# Altium footprint library MyLibrarySum.PcbLib: 208 footprints (part 12 of 13)
Each footprint in its own frame and in the unit in brackets; x right, y up, seen from the top. Pads: shape width x height; smd on the part's side, far side on the other; paste and mask are expansions set on the pad; w line width, h text height; cw(c..) or ccw(c..) is an arc to the next point about the centre after c.
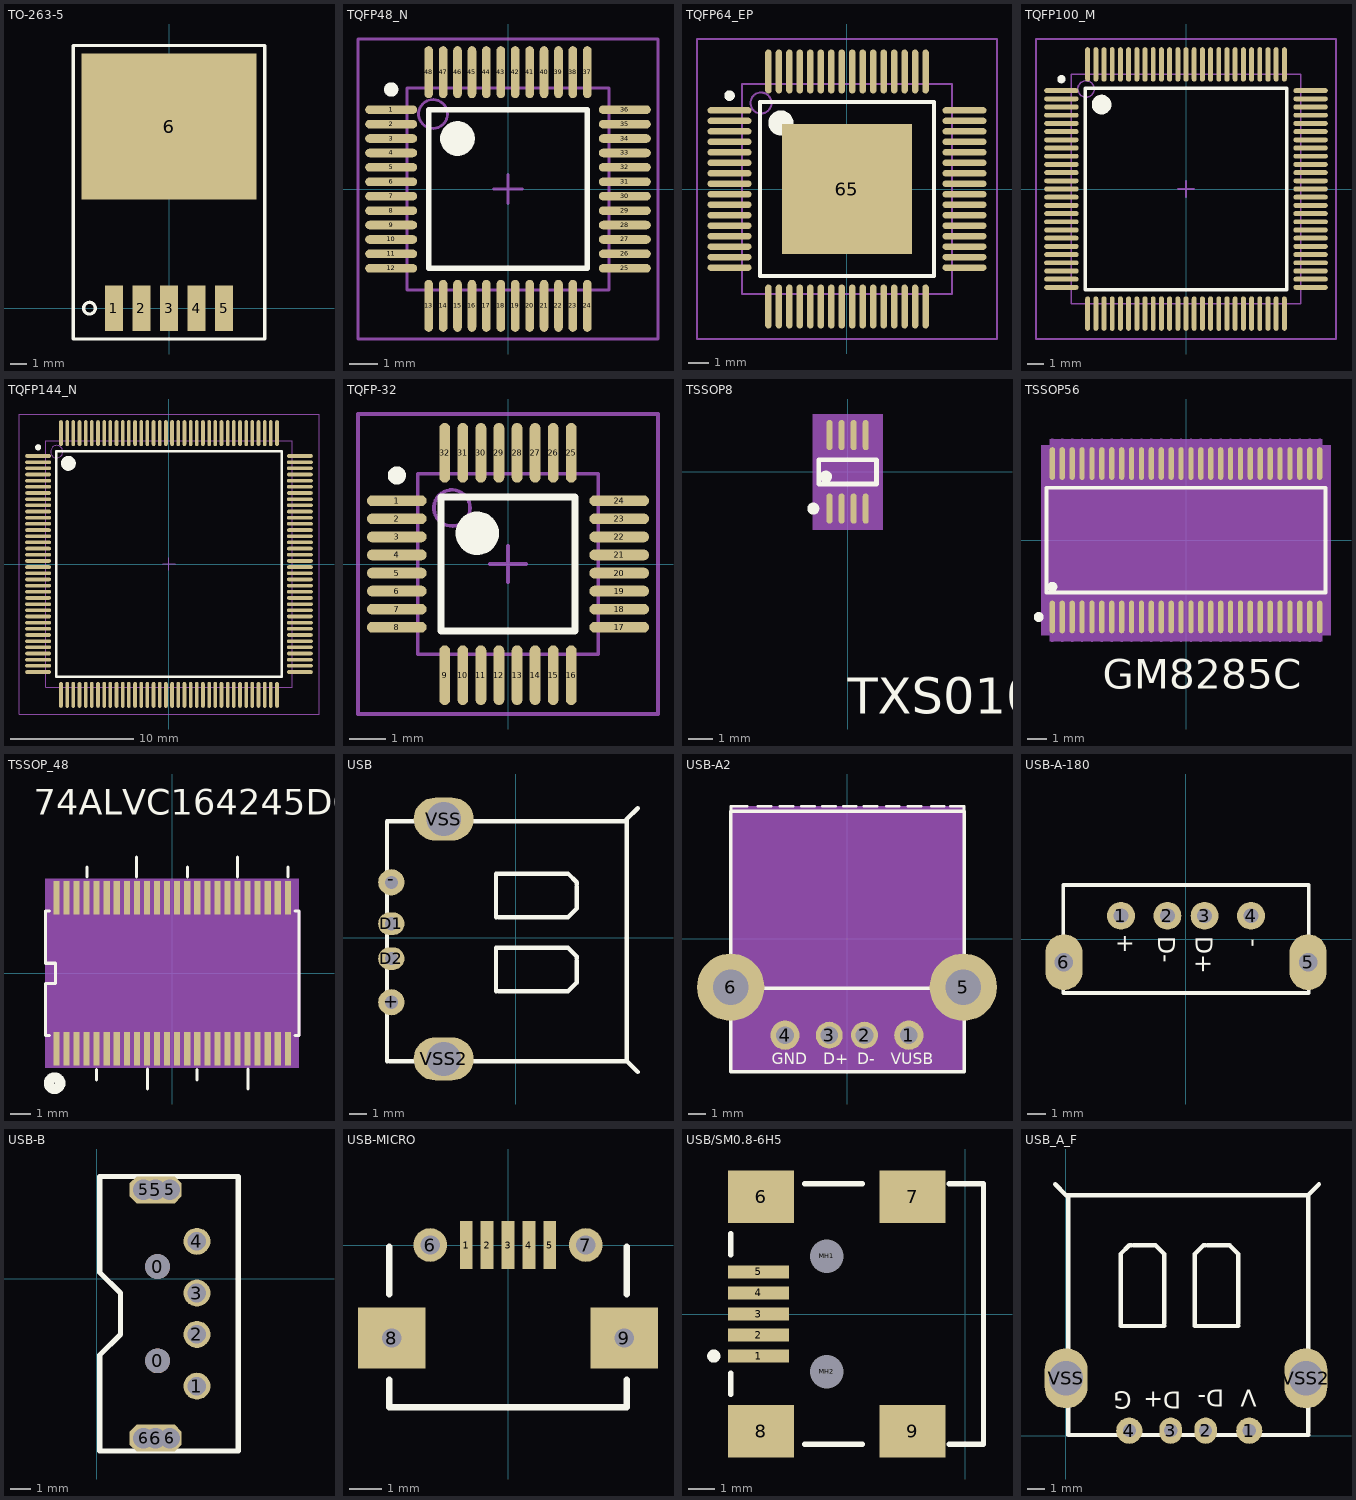
[diagram p11: the footprints below, top view; thin cyan lines are the x and y axes]

## TO-263-5 [mm]
pads (6):
  rect 1.1x2.8 smd: 1(-3.4,0) 2(-1.7,0) 3(0,0) 4(1.7,0) 5(3.4,0)
  rect 10.8x9 smd: 6(0,11.2)
Top Overlay:
  circle w0.2: c-4.902,0 r0.359
  lines w0.2: -5.9,-1.9 -5.9,16.2 5.9,16.2 5.9,-1.9 -5.9,-1.9
3D body: height 4.57, standoff -0.01, extent -5.08,-0.323 5.08,14.318

## TQFP48_N [mm] "Thin QFP, 48-Leads, Body 7x7mm, Pitch 0.5mm, IPC Medium Density"
height 1.6
pads (48):
  oval 1.8x0.3 smd: 1(-4.05,2.75) 2(-4.05,2.25) 3(-4.05,1.75) 4(-4.05,1.25) 5(-4.05,0.75) 6(-4.05,0.25) 7(-4.05,-0.25) 8(-4.05,-0.75) 9(-4.05,-1.25) 10(-4.05,-1.75) 11(-4.05,-2.25) 12(-4.05,-2.75) 25(4.05,-2.75) 26(4.05,-2.25) 27(4.05,-1.75) 28(4.05,-1.25) 29(4.05,-0.75) 30(4.05,-0.25) 31(4.05,0.25) 32(4.05,0.75) 33(4.05,1.25) 34(4.05,1.75) 35(4.05,2.25) 36(4.05,2.75)
  oval 0.3x1.8 smd: 13(-2.75,-4.05) 14(-2.25,-4.05) 15(-1.75,-4.05) 16(-1.25,-4.05) 17(-0.75,-4.05) 18(-0.25,-4.05) 19(0.25,-4.05) 20(0.75,-4.05) 21(1.25,-4.05) 22(1.75,-4.05) 23(2.25,-4.05) 24(2.75,-4.05) 37(2.75,4.05) 38(2.25,4.05) 39(1.75,4.05) 40(1.25,4.05) 41(0.75,4.05) 42(0.25,4.05) 43(-0.25,4.05) 44(-0.75,4.05) 45(-1.25,4.05) 46(-1.75,4.05) 47(-2.25,4.05) 48(-2.75,4.05)
Top Overlay:
  circle w0.25: c-4.05,3.45 r0.125
  circle w0.6: c-1.75,1.75 r0.3
  lines w0.2: -2.75,-2.75 -2.75,2.75 2.75,2.75 2.75,-2.75 -2.75,-2.75
Mechanical 13:
  circle w0.1: c-2.6,2.6 r0.5
  lines w0.1: -3.5,-3.5 -3.5,3.5 3.5,3.5 3.5,-3.5 -3.5,-3.5
Mechanical 15:
  lines w0.1: -0.5,0 0.5,0 ; 0,-0.5 0,0.5 ; -5.2,-5.2 -5.2,5.2 5.2,5.2 5.2,-5.2 -5.2,-5.2
3D body: height 1.1, standoff 0, extent -4.572,-4.445 4.445,4.572

## TQFP64_EP [mm]
height 1.2
pads (65):
  oval 2.1x0.3 smd: 1(-5.6,3.75) 2(-5.6,3.25) 3(-5.6,2.75) 4(-5.6,2.25) 5(-5.6,1.75) 6(-5.6,1.25) 7(-5.6,0.75) 8(-5.6,0.25) 9(-5.6,-0.25) 10(-5.6,-0.75) 11(-5.6,-1.25) 12(-5.6,-1.75) 13(-5.6,-2.25) 14(-5.6,-2.75) 15(-5.6,-3.25) 16(-5.6,-3.75) 33(5.6,-3.75) 34(5.6,-3.25) 35(5.6,-2.75) 36(5.6,-2.25) 37(5.6,-1.75) 38(5.6,-1.25) 39(5.6,-0.75) 40(5.6,-0.25) 41(5.6,0.25) 42(5.6,0.75) 43(5.6,1.25) 44(5.6,1.75) 45(5.6,2.25) 46(5.6,2.75) 47(5.6,3.25) 48(5.6,3.75)
  oval 0.3x2.1 smd: 17(-3.75,-5.6) 18(-3.25,-5.6) 19(-2.75,-5.6) 20(-2.25,-5.6) 21(-1.75,-5.6) 22(-1.25,-5.6) 23(-0.75,-5.6) 24(-0.25,-5.6) 25(0.25,-5.6) 26(0.75,-5.6) 27(1.25,-5.6) 28(1.75,-5.6) 29(2.25,-5.6) 30(2.75,-5.6) 31(3.25,-5.6) 32(3.75,-5.6) 49(3.75,5.6) 50(3.25,5.6) 51(2.75,5.6) 52(2.25,5.6) 53(1.75,5.6) 54(1.25,5.6) 55(0.75,5.6) 56(0.25,5.6) 57(-0.25,5.6) 58(-0.75,5.6) 59(-1.25,5.6) 60(-1.75,5.6) 61(-2.25,5.6) 62(-2.75,5.6) 63(-3.25,5.6) 64(-3.75,5.6)
  rect 6.2x6.2 smd: 65(0,0)
Top Overlay:
  circle w0.6: c-3.15,3.15 r0.3
  circle w0.25: c-5.6,4.45 r0.125
  lines w0.2: -4.15,-4.15 4.15,-4.15 4.15,4.15 -4.15,4.15 -4.15,-4.15
Mechanical 13:
  circle w0.1: c-4.1,4.1 r0.5
  lines w0.1: -5,-5 5,-5 5,5 -5,5 -5,-5
Mechanical 15:
  lines w0.1: -0.5,0 0.5,0 ; 0,-0.5 0,0.5 ; -7.15,-7.15 7.15,-7.15 7.15,7.15 -7.15,7.15 -7.15,-7.15
3D body: height 1.1, standoff 0, extent -5.969,-5.969 6.048,6.048

## TQFP100_M [mm] "Thin QFP, 100-Leads, Body 14x14mm, Pitch 0.5mm, IPC Low Density"
height 1.2
pads (100):
  oval 2.1x0.3 smd: 1(-7.6,6) 2(-7.6,5.5) 3(-7.6,5) 4(-7.6,4.5) 5(-7.6,4) 6(-7.6,3.5) 7(-7.6,3) 8(-7.6,2.5) 9(-7.6,2) 10(-7.6,1.5) 11(-7.6,1) 12(-7.6,0.5) 13(-7.6,0) 14(-7.6,-0.5) 15(-7.6,-1) 16(-7.6,-1.5) 17(-7.6,-2) 18(-7.6,-2.5) 19(-7.6,-3) 20(-7.6,-3.5) 21(-7.6,-4) 22(-7.6,-4.5) 23(-7.6,-5) 24(-7.6,-5.5) 25(-7.6,-6) 51(7.6,-6) 52(7.6,-5.5) 53(7.6,-5) 54(7.6,-4.5) 55(7.6,-4) 56(7.6,-3.5) 57(7.6,-3) 58(7.6,-2.5) 59(7.6,-2) 60(7.6,-1.5) 61(7.6,-1) 62(7.6,-0.5) 63(7.6,0) 64(7.6,0.5) 65(7.6,1) 66(7.6,1.5) 67(7.6,2) 68(7.6,2.5) 69(7.6,3) 70(7.6,3.5) 71(7.6,4) 72(7.6,4.5) 73(7.6,5) 74(7.6,5.5) 75(7.6,6)
  oval 0.3x2.1 smd: 26(-6,-7.6) 27(-5.5,-7.6) 28(-5,-7.6) 29(-4.5,-7.6) 30(-4,-7.6) 31(-3.5,-7.6) 32(-3,-7.6) 33(-2.5,-7.6) 34(-2,-7.6) 35(-1.5,-7.6) 36(-1,-7.6) 37(-0.5,-7.6) 38(0,-7.6) 39(0.5,-7.6) 40(1,-7.6) 41(1.5,-7.6) 42(2,-7.6) 43(2.5,-7.6) 44(3,-7.6) 45(3.5,-7.6) 46(4,-7.6) 47(4.5,-7.6) 48(5,-7.6) 49(5.5,-7.6) 50(6,-7.6) 76(6,7.6) 77(5.5,7.6) 78(5,7.6) 79(4.5,7.6) 80(4,7.6) 81(3.5,7.6) 82(3,7.6) 83(2.5,7.6) 84(2,7.6) 85(1.5,7.6) 86(1,7.6) 87(0.5,7.6) 88(0,7.6) 89(-0.5,7.6) 90(-1,7.6) 91(-1.5,7.6) 92(-2,7.6) 93(-2.5,7.6) 94(-3,7.6) 95(-3.5,7.6) 96(-4,7.6) 97(-4.5,7.6) 98(-5,7.6) 99(-5.5,7.6) 100(-6,7.6)
Top Overlay:
  circle w0.6: c-5.15,5.15 r0.3
  circle w0.25: c-7.6,6.7 r0.125
  lines w0.2: -6.15,-6.15 6.15,-6.15 6.15,6.15 -6.15,6.15 -6.15,-6.15
Mechanical 13:
  circle w0.1: c-6.1,6.1 r0.5
  lines w0.1: -7,-7 7,-7 7,7 -7,7 -7,-7
Mechanical 15:
  lines w0.1: -0.5,0 0.5,0 ; 0,-0.5 0,0.5 ; -9.15,-9.15 9.15,-9.15 9.15,9.15 -9.15,9.15 -9.15,-9.15
3D body: height 1.54, standoff -0.19, extent -7.6,-7.505 7.41,7.505

## TQFP144_N [mm] "TTM32V103ZET6"
height 1.6
pads (144):
  oval 2.1x0.3 smd: 1(-10.6,8.75) 2(-10.6,8.25) 3(-10.6,7.75) 4(-10.6,7.25) 5(-10.6,6.75) 6(-10.6,6.25) 7(-10.6,5.75) 8(-10.6,5.25) 9(-10.6,4.75) 10(-10.6,4.25) 11(-10.6,3.75) 12(-10.6,3.25) 13(-10.6,2.75) 14(-10.6,2.25) 15(-10.6,1.75) 16(-10.6,1.25) 17(-10.6,0.75) 18(-10.6,0.25) 19(-10.6,-0.25) 20(-10.6,-0.75) 21(-10.6,-1.25) 22(-10.6,-1.75) 23(-10.6,-2.25) 24(-10.6,-2.75) 25(-10.6,-3.25) 26(-10.6,-3.75) 27(-10.6,-4.25) 28(-10.6,-4.75) 29(-10.6,-5.25) 30(-10.6,-5.75) 31(-10.6,-6.25) 32(-10.6,-6.75) 33(-10.6,-7.25) 34(-10.6,-7.75) 35(-10.6,-8.25) 36(-10.6,-8.75) 73(10.6,-8.75) 74(10.6,-8.25) 75(10.6,-7.75) 76(10.6,-7.25) 77(10.6,-6.75) 78(10.6,-6.25) 79(10.6,-5.75) 80(10.6,-5.25) 81(10.6,-4.75) 82(10.6,-4.25) 83(10.6,-3.75) 84(10.6,-3.25) 85(10.6,-2.75) 86(10.6,-2.25) 87(10.6,-1.75) 88(10.6,-1.25) 89(10.6,-0.75) 90(10.6,-0.25) 91(10.6,0.25) 92(10.6,0.75) 93(10.6,1.25) 94(10.6,1.75) 95(10.6,2.25) 96(10.6,2.75) 97(10.6,3.25) 98(10.6,3.75) 99(10.6,4.25) 100(10.6,4.75) 101(10.6,5.25) 102(10.6,5.75) 103(10.6,6.25) 104(10.6,6.75) 105(10.6,7.25) 106(10.6,7.75) 107(10.6,8.25) 108(10.6,8.75)
  oval 0.3x2.1 smd: 37(-8.75,-10.6) 38(-8.25,-10.6) 39(-7.75,-10.6) 40(-7.25,-10.6) 41(-6.75,-10.6) 42(-6.25,-10.6) 43(-5.75,-10.6) 44(-5.25,-10.6) 45(-4.75,-10.6) 46(-4.25,-10.6) 47(-3.75,-10.6) 48(-3.25,-10.6) 49(-2.75,-10.6) 50(-2.25,-10.6) 51(-1.75,-10.6) 52(-1.25,-10.6) 53(-0.75,-10.6) 54(-0.25,-10.6) 55(0.25,-10.6) 56(0.75,-10.6) 57(1.25,-10.6) 58(1.75,-10.6) 59(2.25,-10.6) 60(2.75,-10.6) 61(3.25,-10.6) 62(3.75,-10.6) 63(4.25,-10.6) 64(4.75,-10.6) 65(5.25,-10.6) 66(5.75,-10.6) 67(6.25,-10.6) 68(6.75,-10.6) 69(7.25,-10.6) 70(7.75,-10.6) 71(8.25,-10.6) 72(8.75,-10.6) 109(8.75,10.6) 110(8.25,10.6) 111(7.75,10.6) 112(7.25,10.6) 113(6.75,10.6) 114(6.25,10.6) 115(5.75,10.6) 116(5.25,10.6) 117(4.75,10.6) 118(4.25,10.6) 119(3.75,10.6) 120(3.25,10.6) 121(2.75,10.6) 122(2.25,10.6) 123(1.75,10.6) 124(1.25,10.6) 125(0.75,10.6) 126(0.25,10.6) 127(-0.25,10.6) 128(-0.75,10.6) 129(-1.25,10.6) 130(-1.75,10.6) 131(-2.25,10.6) 132(-2.75,10.6) 133(-3.25,10.6) 134(-3.75,10.6) 135(-4.25,10.6) 136(-4.75,10.6) 137(-5.25,10.6) 138(-5.75,10.6) 139(-6.25,10.6) 140(-6.75,10.6) 141(-7.25,10.6) 142(-7.75,10.6) 143(-8.25,10.6) 144(-8.75,10.6)
Top Overlay:
  circle w0.6: c-8.15,8.15 r0.3
  circle w0.25: c-10.6,9.45 r0.125
  lines w0.2: -9.15,-9.15 9.15,-9.15 9.15,9.15 -9.15,9.15 -9.15,-9.15
Mechanical 13:
  circle w0.1: c-9.1,9.1 r0.5
  lines w0.1: -10,-10 10,-10 10,10 -10,10 -10,-10
Mechanical 15:
  lines w0.1: -0.5,0 0.5,0 ; 0,-0.5 0,0.5 ; -12.15,-12.15 12.15,-12.15 12.15,12.15 -12.15,12.15 -12.15,-12.15
3D body: height 0.8, standoff -0.85, extent -10.951,-10.951 11.049,11.049

## TQFP-32 [mm]
height 1.2
pads (32):
  oval 1.65x0.3 smd: 1(-3.075,1.75) 2(-3.075,1.25) 3(-3.075,0.75) 4(-3.075,0.25) 5(-3.075,-0.25) 6(-3.075,-0.75) 7(-3.075,-1.25) 8(-3.075,-1.75) 17(3.075,-1.75) 18(3.075,-1.25) 19(3.075,-0.75) 20(3.075,-0.25) 21(3.075,0.25) 22(3.075,0.75) 23(3.075,1.25) 24(3.075,1.75)
  oval 0.3x1.65 smd: 9(-1.75,-3.075) 10(-1.25,-3.075) 11(-0.75,-3.075) 12(-0.25,-3.075) 13(0.25,-3.075) 14(0.75,-3.075) 15(1.25,-3.075) 16(1.75,-3.075) 25(1.75,3.075) 26(1.25,3.075) 27(0.75,3.075) 28(0.25,3.075) 29(-0.25,3.075) 30(-0.75,3.075) 31(-1.25,3.075) 32(-1.75,3.075)
Top Overlay:
  circle w0.6: c-0.85,0.85 r0.3
  circle w0.25: c-3.075,2.45 r0.125
  lines w0.2: -1.85,-1.85 1.85,-1.85 1.85,1.85 -1.85,1.85 -1.85,-1.85
Mechanical 13:
  circle w0.1: c-1.55,1.55 r0.5
  lines w0.1: -2.5,-2.5 2.5,-2.5 2.5,2.5 -2.5,2.5 -2.5,-2.5
Mechanical 15:
  lines w0.1: -0.5,0 0.5,0 ; 0,-0.5 0,0.5 ; -4.15,-4.15 4.15,-4.15 4.15,4.15 -4.15,4.15 -4.15,-4.15
3D body: height 0.65, standoff -0.58, extent -3.556,-3.5 3.444,3.5

## TSSOP8 [mm] "TSSOP8"
pads (8):
  oval 0.25x1.25 smd: 1(-0.75,-1.525) 2(-0.25,-1.525) 3(0.25,-1.525) 4(0.75,-1.525) 5(0.75,1.525) 6(0.25,1.525) 7(-0.25,1.525) 8(-0.75,1.525)
Top Overlay:
  circle w0.25: c-0.9,-0.2 r0.125
  circle w0.25: c-1.425,-1.525 r0.125
  lines w0.2: -1.2,-0.5 1.2,-0.5 1.2,0.5 -1.2,0.5 -1.2,-0.5
  text "TXS0102DCU" at 0,-10.05 h1.5
Mechanical 11:
  text "3" at 0.25,-1.885 h0.4
  text "5" at 0.75,1.165 h0.4
  text "7" at -0.25,1.165 h0.4
  text "2" at -0.25,-1.885 h0.4
  text "1" at -0.75,-1.885 h0.4
  text "8" at -0.75,1.165 h0.4
  text "4" at 0.75,-1.885 h0.4
  text "6" at 0.25,1.165 h0.4
Mechanical 12:
  circle w0.4: c-0.7,-0.55 r0.2
  lines w0.2: -0.75,-1.2 -0.75,-1.05 ; -0.75,1.05 -0.75,1.2 ; -0.25,-1.2 -0.25,-1.05 ; -0.25,1.05 -0.25,1.2 ; 0.25,-1.2 0.25,-1.05 ; 0.25,1.05 0.25,1.2 ; 0.75,-1.2 0.75,-1.05 ; 0.75,1.05 0.75,1.2 ; -1.2,-1.05 1.2,-1.05 1.2,1.05 -1.2,1.05 -1.2,-1.05
  lines w0.25: -0.75,-1.55 -0.75,-1.2 ; -0.75,1.2 -0.75,1.55 ; -0.25,-1.55 -0.25,-1.2 ; -0.25,1.2 -0.25,1.55 ; 0.25,-1.55 0.25,-1.2 ; 0.25,1.2 0.25,1.55 ; 0.75,-1.55 0.75,-1.2 ; 0.75,1.2 0.75,1.55
  text "pn" at 0,-0.52 h0.4
Mechanical 13:
  region: -1.45,-2.4 1.45,-2.4 1.45,2.4 -1.45,2.4
Mechanical 16:
  pour cut-out: -0.875,-1.6 -0.875,-1.05 -1.2,-1.05 -1.2,1.05 -0.875,1.05 -0.875,1.6 0.875,1.6 0.875,1.05 1.2,1.05 1.2,-1.05 0.875,-1.05 0.875,-1.6
3D body: height 1.1, standoff 0, extent -1.423,-2.032 1.677,2.068

## TSSOP56 [mm] "TSSOP56"
pads (56):
  oval 0.27x1.65 smd: 1(-6.75,-3.875) 2(-6.25,-3.875) 3(-5.75,-3.875) 4(-5.25,-3.875) 5(-4.75,-3.875) 6(-4.25,-3.875) 7(-3.75,-3.875) 8(-3.25,-3.875) 9(-2.75,-3.875) 10(-2.25,-3.875) 11(-1.75,-3.875) 12(-1.25,-3.875) 13(-0.75,-3.875) 14(-0.25,-3.875) 15(0.25,-3.875) 16(0.75,-3.875) 17(1.25,-3.875) 18(1.75,-3.875) 19(2.25,-3.875) 20(2.75,-3.875) 21(3.25,-3.875) 22(3.75,-3.875) 23(4.25,-3.875) 24(4.75,-3.875) 25(5.25,-3.875) 26(5.75,-3.875) 27(6.25,-3.875) 28(6.75,-3.875) 29(6.75,3.875) 30(6.25,3.875) 31(5.75,3.875) 32(5.25,3.875) 33(4.75,3.875) 34(4.25,3.875) 35(3.75,3.875) 36(3.25,3.875) 37(2.75,3.875) 38(2.25,3.875) 39(1.75,3.875) 40(1.25,3.875) 41(0.75,3.875) 42(0.25,3.875) 43(-0.25,3.875) 44(-0.75,3.875) 45(-1.25,3.875) 46(-1.75,3.875) 47(-2.25,3.875) 48(-2.75,3.875) 49(-3.25,3.875) 50(-3.75,3.875) 51(-4.25,3.875) 52(-4.75,3.875) 53(-5.25,3.875) 54(-5.75,3.875) 55(-6.25,3.875) 56(-6.75,3.875)
Top Overlay:
  circle w0.25: c-7.435,-3.875 r0.125
  circle w0.25: c-6.75,-2.35 r0.125
  lines w0.2: -7.05,-2.65 -7.05,2.65 7.05,2.65 7.05,-2.65 -7.05,-2.65
  text "GM8285C" at -4.2,-7.5 h1.5
Mechanical 11:
  text "38" at 1.93,3.675 h0.4
  text "37" at 2.43,3.675 h0.4
  text "48" at -3.07,3.675 h0.4
  text "17" at 0.93,-4.075 h0.4
  text "45" at -1.57,3.675 h0.4
  text "41" at 0.43,3.675 h0.4
  text "47" at -2.57,3.675 h0.4
  text "40" at 0.93,3.675 h0.4
  text "39" at 1.43,3.675 h0.4
  text "46" at -2.07,3.675 h0.4
  text "42" at -0.07,3.675 h0.4
  text "24" at 4.43,-4.075 h0.4
  text "23" at 3.93,-4.075 h0.4
  text "22" at 3.43,-4.075 h0.4
  text "20" at 2.43,-4.075 h0.4
  text "19" at 1.93,-4.075 h0.4
  text "15" at -0.07,-4.075 h0.4
  text "52" at -5.07,3.675 h0.4
  text "11" at -2.07,-4.075 h0.4
  text "14" at -0.57,-4.075 h0.4
  text "12" at -1.57,-4.075 h0.4
  text "51" at -4.57,3.675 h0.4
  text "56" at -7.07,3.675 h0.4
  text "4" at -5.41,-4.075 h0.4
  text "3" at -5.91,-4.075 h0.4
  text "54" at -6.07,3.675 h0.4
  text "7" at -3.91,-4.075 h0.4
  text "6" at -4.41,-4.075 h0.4
  text "55" at -6.57,3.675 h0.4
  text "29" at 6.43,3.675 h0.4
  text "36" at 2.93,3.675 h0.4
  text "35" at 3.43,3.675 h0.4
  text "33" at 4.43,3.675 h0.4
  text "49" at -3.57,3.675 h0.4
  text "50" at -4.07,3.675 h0.4
  text "53" at -5.57,3.675 h0.4
  text "10" at -2.57,-4.075 h0.4
  text "5" at -4.91,-4.075 h0.4
  text "8" at -3.41,-4.075 h0.4
  text "2" at -6.41,-4.075 h0.4
  text "18" at 1.43,-4.075 h0.4
  text "21" at 2.93,-4.075 h0.4
  text "25" at 4.93,-4.075 h0.4
  text "16" at 0.43,-4.075 h0.4
  text "13" at -1.07,-4.075 h0.4
  text "43" at -0.57,3.675 h0.4
  text "32" at 4.93,3.675 h0.4
  text "27" at 5.93,-4.075 h0.4
  text "28" at 6.43,-4.075 h0.4
  text "30" at 5.93,3.675 h0.4
  text "31" at 5.43,3.675 h0.4
  text "1" at -6.91,-4.075 h0.4
  text "26" at 5.43,-4.075 h0.4
  text "9" at -2.91,-4.075 h0.4
  text "44" at -1.07,3.675 h0.4
  text "34" at 3.93,3.675 h0.4
Mechanical 12:
  circle w0.4: c-6.55,-3.55 r0.2
  lines w0.2: -6.75,-4.25 -6.75,-4.05 ; -6.75,4.05 -6.75,4.25 ; -6.25,-4.25 -6.25,-4.05 ; -6.25,4.05 -6.25,4.25 ; -5.75,-4.25 -5.75,-4.05 ; -5.75,4.05 -5.75,4.25 ; -5.25,-4.25 -5.25,-4.05 ; -5.25,4.05 -5.25,4.25 ; -4.75,-4.25 -4.75,-4.05 ; -4.75,4.05 -4.75,4.25 ; -4.25,-4.25 -4.25,-4.05 ; -4.25,4.05 -4.25,4.25 ; -3.75,-4.25 -3.75,-4.05 ; -3.75,4.05 -3.75,4.25 ; -3.25,-4.25 -3.25,-4.05 ; -3.25,4.05 -3.25,4.25 ; -2.75,-4.25 -2.75,-4.05 ; -2.75,4.05 -2.75,4.25 ; -2.25,-4.25 -2.25,-4.05 ; -2.25,4.05 -2.25,4.25 ; -1.75,-4.25 -1.75,-4.05 ; -1.75,4.05 -1.75,4.25 ; -1.25,-4.25 -1.25,-4.05 ; -1.25,4.05 -1.25,4.25 ; -0.75,-4.25 -0.75,-4.05 ; -0.75,4.05 -0.75,4.25 ; -0.25,-4.25 -0.25,-4.05 ; -0.25,4.05 -0.25,4.25 ; 0.25,-4.25 0.25,-4.05 ; 0.25,4.05 0.25,4.25 ; 0.75,-4.25 0.75,-4.05 ; 0.75,4.05 0.75,4.25 ; 1.25,-4.25 1.25,-4.05 ; 1.25,4.05 1.25,4.25 ; 1.75,-4.25 1.75,-4.05 ; 1.75,4.05 1.75,4.25 ; 2.25,-4.25 2.25,-4.05 ; 2.25,4.05 2.25,4.25 ; 2.75,-4.25 2.75,-4.05 ; 2.75,4.05 2.75,4.25 ; 3.25,-4.25 3.25,-4.05 ; 3.25,4.05 3.25,4.25 ; 3.75,-4.25 3.75,-4.05 ; 3.75,4.05 3.75,4.25 ; 4.25,-4.25 4.25,-4.05 ; 4.25,4.05 4.25,4.25 ; 4.75,-4.25 4.75,-4.05 ; 4.75,4.05 4.75,4.25 ; 5.25,-4.25 5.25,-4.05 ; 5.25,4.05 5.25,4.25 ; 5.75,-4.25 5.75,-4.05 ; 5.75,4.05 5.75,4.25 ; 6.25,-4.25 6.25,-4.05 ; 6.25,4.05 6.25,4.25 ; 6.75,-4.25 6.75,-4.05 ; 6.75,4.05 6.75,4.25 ; -7.05,-4.05 -7.05,4.05 7.05,4.05 7.05,-4.05 -7.05,-4.05
  lines w0.27: -6.75,-5 -6.75,-4.25 ; -6.75,4.25 -6.75,5 ; -6.25,-5 -6.25,-4.25 ; -6.25,4.25 -6.25,5 ; -5.75,-5 -5.75,-4.25 ; -5.75,4.25 -5.75,5 ; -5.25,-5 -5.25,-4.25 ; -5.25,4.25 -5.25,5 ; -4.75,-5 -4.75,-4.25 ; -4.75,4.25 -4.75,5 ; -4.25,-5 -4.25,-4.25 ; -4.25,4.25 -4.25,5 ; -3.75,-5 -3.75,-4.25 ; -3.75,4.25 -3.75,5 ; -3.25,-5 -3.25,-4.25 ; -3.25,4.25 -3.25,5 ; -2.75,-5 -2.75,-4.25 ; -2.75,4.25 -2.75,5 ; -2.25,-5 -2.25,-4.25 ; -2.25,4.25 -2.25,5 ; -1.75,-5 -1.75,-4.25 ; -1.75,4.25 -1.75,5 ; -1.25,-5 -1.25,-4.25 ; -1.25,4.25 -1.25,5 ; -0.75,-5 -0.75,-4.25 ; -0.75,4.25 -0.75,5 ; -0.25,-5 -0.25,-4.25 ; -0.25,4.25 -0.25,5 ; 0.25,-5 0.25,-4.25 ; 0.25,4.25 0.25,5 ; 0.75,-5 0.75,-4.25 ; 0.75,4.25 0.75,5 ; 1.25,-5 1.25,-4.25 ; 1.25,4.25 1.25,5 ; 1.75,-5 1.75,-4.25 ; 1.75,4.25 1.75,5 ; 2.25,-5 2.25,-4.25 ; 2.25,4.25 2.25,5 ; 2.75,-5 2.75,-4.25 ; 2.75,4.25 2.75,5 ; 3.25,-5 3.25,-4.25 ; 3.25,4.25 3.25,5 ; 3.75,-5 3.75,-4.25 ; 3.75,4.25 3.75,5 ; 4.25,-5 4.25,-4.25 ; 4.25,4.25 4.25,5 ; 4.75,-5 4.75,-4.25 ; 4.75,4.25 4.75,5 ; 5.25,-5 5.25,-4.25 ; 5.25,4.25 5.25,5 ; 5.75,-5 5.75,-4.25 ; 5.75,4.25 5.75,5 ; 6.25,-5 6.25,-4.25 ; 6.25,4.25 6.25,5 ; 6.75,-5 6.75,-4.25 ; 6.75,4.25 6.75,5
  text ".Designator" at -0.48,-0.2 h0.4
  text "GM8285C" at -1.12,-0.2 h0.4
  text "RichardLC" at -1.44,-0.2 h0.4
  text "pn" at -0.32,-0.2 h0.4
Mechanical 13:
  region: 7.3,-4.8 7.3,4.8 -7.3,4.8 -7.3,-4.8
Mechanical 16:
  pour cut-out: -6.885,-5.1 -6.885,-4.05 -7.05,-4.05 -7.05,4.05 -6.885,4.05 -6.885,5.1 6.885,5.1 6.885,4.05 7.05,4.05 7.05,-4.05 6.885,-4.05 6.885,-5.1

## TSSOP_48 [mil] "TSSOP_48"
pads (48):
  rect 12x65 smd: 1(-226.38,-147.64) 2(-206.69,-147.64) 3(-187.01,-147.64) 4(-167.32,-147.64) 5(-147.64,-147.64) 6(-127.95,-147.64) 7(-108.27,-147.64) 8(-88.58,-147.64) 9(-68.9,-147.64) 10(-49.21,-147.64) 11(-29.53,-147.64) 12(-9.84,-147.64) 13(9.84,-147.64) 14(29.53,-147.64) 15(49.21,-147.64) 16(68.9,-147.64) 17(88.58,-147.64) 18(108.27,-147.64) 19(127.95,-147.64) 20(147.64,-147.64) 21(167.32,-147.64) 22(187.01,-147.64) 23(206.69,-147.64) 24(226.38,-147.64) 25(226.38,147.64) 26(206.69,147.64) 27(187.01,147.64) 28(167.32,147.64) 29(147.64,147.64) 30(127.95,147.64) 31(108.27,147.64) 32(88.58,147.64) 33(68.9,147.64) 34(49.21,147.64) 35(29.53,147.64) 36(9.84,147.64) 37(-9.84,147.64) 38(-29.53,147.64) 39(-49.21,147.64) 40(-68.9,147.64) 41(-88.58,147.64) 42(-108.27,147.64) 43(-127.95,147.64) 44(-147.64,147.64) 45(-167.32,147.64) 46(-187.01,147.64) 47(-206.69,147.64) 48(-226.38,147.64)
Top Overlay:
  circle w20: c-230,-215 r11.18
  lines w5.98: -240.16,-122.05 -248.03,-122.05 -248.03,-19.69 -228.35,-19.69 -228.35,19.69 -248.03,19.69 -248.03,122.05 -240.16,122.05 ; -166.93,188.19 -166.93,207.87 ; -148.03,-208.27 -148.03,-188.58 ; -69.29,188.19 -69.29,227.56 ; -48.43,-226.38 -48.43,-187.01 ; 29.92,188.19 29.92,207.87 ; 48.82,-208.27 48.82,-188.58 ; 127.56,188.19 127.56,227.56 ; 148.43,-226.38 148.43,-187.01 ; 226.77,188.19 226.77,207.87 ; 240.16,-122.05 248.03,-122.05 248.03,122.05 240.16,122.05
  text "74ALVC164245DGG" at -271.14,310.55 h50
  text ".Designator" at -160,-254.69 h30
Mechanical 11:
  text "48" at -206.38,147.64 h25
  text "25" at 246.38,147.64 h25
  text "11" at -9.53,-147.64 h25
  text "13" at 29.84,-147.64 h25
  text "8" at -78.58,-147.64 h25
  text "23" at 226.69,-147.64 h25
  text "5" at -137.64,-147.64 h25
  text "2" at -196.69,-147.64 h25
  text "19" at 147.95,-147.64 h25
  text "12" at 10.16,-147.64 h25
  text "14" at 49.53,-147.64 h25
  text "20" at 167.64,-147.64 h25
  text "3" at -177.01,-147.64 h25
  text "16" at 88.9,-147.64 h25
  text "22" at 207.01,-147.64 h25
  text "24" at 246.38,-147.64 h25
  text "6" at -117.95,-147.64 h25
  text "9" at -58.9,-147.64 h25
  text "17" at 108.58,-147.64 h25
  text "42" at -88.27,147.64 h25
  text "31" at 128.27,147.64 h25
  text "1" at -216.38,-147.64 h25
  text "7" at -98.27,-147.64 h25
  text "18" at 128.27,-147.64 h25
  text "28" at 187.32,147.64 h25
  text "34" at 69.21,147.64 h25
  text "39" at -29.21,147.64 h25
  text "45" at -147.32,147.64 h25
  text "21" at 187.32,-147.64 h25
  text "15" at 69.21,-147.64 h25
  text "10" at -29.21,-147.64 h25
  text "4" at -157.32,-147.64 h25
  text "29" at 167.64,147.64 h25
  text "38" at -9.53,147.64 h25
  text "37" at 10.16,147.64 h25
  text "30" at 147.95,147.64 h25
  text "26" at 226.69,147.64 h25
  text "40" at -48.9,147.64 h25
  text "27" at 207.01,147.64 h25
  text "35" at 49.53,147.64 h25
  text "33" at 88.9,147.64 h25
  text "36" at 29.84,147.64 h25
  text "32" at 108.58,147.64 h25
  text "47" at -186.69,147.64 h25
  text "46" at -167.01,147.64 h25
  text "44" at -127.64,147.64 h25
  text "43" at -107.95,147.64 h25
  text "41" at -68.58,147.64 h25
Mechanical 12:
  lines w5.98: -248.03,-122.05 248.03,-122.05 248.03,122.05 -248.03,122.05 -248.03,19.69 -228.35,19.69 -228.35,-19.69 -248.03,-19.69 -248.03,-122.05
  text "TSSOP_48" at -162.8,397.52 h50
Mechanical 13:
  region: -248.03,-185.04 -248.03,185.04 248.03,185.04 248.03,-185.04

## USB [mm]
pads (6):
  round 1.524 hole 0.762: +(-7.255,-3.757) -(-7.255,3.228)
  oval 1.524x1.324 hole 0.762: D1(-7.255,0.815) D2(-7.255,-1.217)
  oval 3.5x2.5 hole 2: VSS(-4.207,6.911) VSS2(-4.207,-7.059)
Top Overlay:
  lines w0.254: -7.509,-7.186 -7.509,6.784 6.461,6.784 ; -7.382,-7.186 6.461,-7.186 ; -1.159,-3.122 -1.159,-0.582 3.032,-0.582 3.54,-1.09 3.54,-1.217 ; -1.159,1.196 -1.159,3.736 3.032,3.736 3.54,3.228 3.54,3.101 ; -1.032,-3.122 3.032,-3.122 3.54,-2.614 3.54,-1.344 ; -1.032,1.196 3.032,1.196 3.54,1.704 3.54,2.974 ; 7.096,-7.821 6.461,-7.186 ; 7.096,7.546 6.461,6.911 6.461,6.784 ; 6.461,-7.186 6.461,6.784

## USB-A2 [mil] "USB-A2"
pads (6):
  round 65 hole 39.37: 1(136.5,-214.5) 4(-139.1,-214.5)
  round 60 hole 39.37: 2(37.9,-214.5) 3(-40.6,-214.5)
  round 150 hole 78.74: 5(257.9,-107.5) 6(-260.1,-107.5)
Top Overlay:
  lines w6: -259.5,283.5 -259.5,295.5 -223.5,295.5 ; -199.5,295.5 -170.5,295.5 ; -150.5,295.5 -121.5,295.5 ; -102.5,295.5 -73.5,295.5 ; -55.5,295.5 -26.5,295.5 ; -9.5,295.5 19.5,295.5 ; 36.5,295.5 65.5,295.5 ; 86.5,295.5 115.5,295.5 ; 134.5,295.5 163.5,295.5 ; 186.5,295.5 215.5,295.5 ; 229.5,295.5 259.5,295.5 259.5,283.5
  lines w8: -260.1,-107.5 -260.1,-296 259.9,-296 259.9,284 -260.1,284 -260.1,-107.9 -258.5,-109.5 256.5,-109.5
  text "VUSB" at 96.5,-279.5 h25
  text "D-" at 21.5,-279.5 h25
  text "D+" at -53.5,-279.5 h25
  text "GND" at -168.5,-279.5 h25
  text ".Designator" at 285,280 h30
Mechanical 11:
  text "5" at 257.9,-97.5 h25
  text "4" at -139.1,-204.5 h25
  text "6" at -260.1,-97.5 h25
  text "1" at 136.5,-204.5 h25
  text "3" at -40.6,-204.5 h25
  text "2" at 37.9,-204.5 h25
Mechanical 13:
  region: -259.5,295.5 -259.5,-295.5 259.5,-295.5 259.5,295.5

## USB-A-180 [mm]
pads (6):
  round 1.5 hole 0.8: 1(-3.5,1.25) 2(-1,1.25) 3(1,1.25) 4(3.5,1.25)
  oval 2x3 hole 1: 5(6.57,-1.25) 6(-6.57,-1.25)
Top Overlay:
  lines w0.2: -6.6,-2.9 -6.6,2.9 6.6,2.9 6.6,-2.9 -6.6,-2.9
  text "-" at 3.953,-0.452 h0.91
  text "D+" at 0.524,0.158 h0.91
  text "D-" at -1.483,0.158 h0.91
  text "+" at -3.794,-0.655 h0.91
3D body: height 14.8, standoff -4, extent -7.85,-3.309 7.85,3.531

## USB-B [mm]
pads (12):
  round 1.2 hole 1.2 unplated: 0(2.943,-3.977) 0(2.943,0.573)
  round 1.3 hole 0.9: 1(4.843,-5.202) 2(4.843,-2.702) 3(4.843,-0.702) 4(4.843,1.798)
  round 1 hole 1: 5(2.265,4.285) 5(3.535,4.285) 6(2.265,-7.715) 6(3.535,-7.715)
  oct 2.5x1.3 hole 1: 5(2.843,4.285) 6(2.843,-7.715)
Top Overlay:
  lines w0.254: 0.143,-8.338 0.143,-3.702 1.143,-2.702 1.143,-0.702 0.143,0.298 0.143,4.934 ; 0.182,-8.338 6.843,-8.338 6.843,4.934 0.182,4.934

## USB-MICRO [mm]
pads (9):
  rect 0.4x1.5 smd: 1(-1.3,0) 2(-0.65,0) 3(0,0) 4(0.65,0) 5(1.3,0)
  round 1.05 hole 0.6: 6(-2.425,0) 7(2.425,0)
  rect 2.1x1.9 hole 0.6: 8(-3.625,-2.9) 9(3.625,-2.9)
Top Overlay:
  lines w0.203: -3.7,-4.195 -3.7,-5.05 3.7,-5.05 3.7,-4.195 ; -3.7,-1.528 -3.7,-0.05 ; 3.7,-1.528 3.7,-0.05
3D body: height 0.54, standoff -2.46, extent -5.162,-4.838 3.638,0.762

## USB/SM0.8-6H5 [mm]
pads (11):
  rect 2.3x0.5 smd: 1(-7.85,-1.6) 2(-7.85,-0.8) 3(-7.85,0) 4(-7.85,0.8) 5(-7.85,1.6)
  rect 2.5x2 smd: 6(-7.75,4.45) 7(-1.996,4.45) 8(-7.75,-4.45) 9(-1.996,-4.45)
  round 0.6 hole 1.27 unplated: MH1(-5.25,2.2) MH2(-5.25,-2.2)
Top Overlay:
  circle w0.25: c-9.55,-1.6 r0.125
  lines w0.2: -8.9,-3.05 -8.9,-2.25 ; -8.9,2.25 -8.9,3.05 ; -6.1,-4.95 -3.9,-4.95 ; -6.1,4.95 -3.9,4.95 ; -0.6,-4.95 0.7,-4.95 0.7,4.95 -0.6,4.95

## USB_A_F [mm] "USB A_Fimale"
pads (6):
  round 1.524 hole 0.762: 1(10.687,0.285) 4(3.702,0.285)
  oval 1.324x1.524 hole 0.762: 2(8.147,0.285) 3(6.115,0.285)
  oval 2.5x3.5 hole 2: VSS(0.019,3.333) VSS2(13.989,3.333)
Top Overlay:
  lines w0.254: -0.616,14.636 0.019,14.001 0.146,14.001 ; 3.829,11.08 3.702,11.08 3.194,10.572 3.194,6.381 5.734,6.381 ; 3.956,11.08 5.226,11.08 5.734,10.572 5.734,6.508 ; 8.147,11.08 8.02,11.08 7.512,10.572 7.512,6.381 10.052,6.381 ; 8.274,11.08 9.544,11.08 10.052,10.572 10.052,6.508 ; 14.116,0.031 0.146,0.031 0.146,14.001 ; 14.116,0.158 14.116,14.001 ; 14.751,14.636 14.116,14.001 ; 0.146,14.001 14.116,14.001
  text "D+" at 6.731,2.565 h1
  text "V" at 11.131,2.665 h1
  text "G" at 3.831,2.565 h1
  text "D-" at 9.231,2.665 h1